# Altium schematic symbol library jlcpcb_2025_04_inductors_extended_0402.schlib: 1396 symbols (part 7 of 8) (continued)
## VHF100505HQ1N8BT
designator L?  Inductance: 1.8nH
Inductor, 1.8nH, SMD 0402; Manufacturer: FH (Guangdong Fenghua Advanced Tech); Manufacturer Part Number: VHF100505HQ1N8BT; Package Size: 0402; JLCPCB Basic Part: No; JLCPCB Part Number: C3032781; Supplier 1: LCSC; Category: Inductors; Supplier Part Number 1: C3032781; RoHS: Yes; ComponentLink1Description: Datasheet; ComponentLink1URL: https://wmsc.lcsc.com/wmsc/upload/file/pdf/v2/lcsc/2302231130_FH--Guangdong-Fenghua-Advanced-Tech-VHF100505HQ1N8BT_C3032781.pdf; ComponentLink2Description: JLCPCB Part URL; ComponentLink2URL: https://jlcpcb.com/partdetail/C3032781; ComponentLink3Description: LCSC Part URL; ComponentLink3URL: https://lcsc.com/product-detail/Inductors-SMD_FH-Guangdong-Fenghua-Advanced-Tech-FH-Guangdong-Fenghua-Advanced-Tech-VHF100505HQ1N8BT_C3032781.html
footprint IND-0402 (0402 (1005M) Inductor)
pins: 1, 2

## VHF100505HQ1N8ST
designator L?  Inductance: 1.8nH
Inductor, 1.8nH, 100mΩ, 300mA, SMD 0402; Manufacturer: FH(Guangdong Fenghua Advanced Tech); Manufacturer Part Number: VHF100505HQ1N8ST; Package Size: 0402; JLCPCB Basic Part: No; JLCPCB Part Number: C395057; Supplier 1: LCSC; Category: Inductors; Supplier Part Number 1: C395057; Rated Current: 300mA; DC Resistance: 100mΩ; RoHS: Yes; ComponentLink1Description: Datasheet; ComponentLink1URL: https://wmsc.lcsc.com/wmsc/upload/file/pdf/v2/lcsc/2302231208_FH--Guangdong-Fenghua-Advanced-Tech-VHF100505HQ1N8ST_C395057.pdf; ComponentLink2Description: JLCPCB Part URL; ComponentLink2URL: https://jlcpcb.com/partdetail/C395057; ComponentLink3Description: LCSC Part URL; ComponentLink3URL: https://lcsc.com/product-detail/Inductors-SMD_FH-Guangdong-Fenghua-Advanced-Tech-FH-Guangdong-Fenghua-Advanced-Tech-VHF100505HQ1N8ST_C395057.html
footprint IND-0402 (0402 (1005M) Inductor)
pins: 1, 2

## VHF100505HQ2N2ST
designator L?  Inductance: 2.2nH
Inductor, 2.2nH, 200mΩ, 300mA, SMD 0402; Manufacturer: FH(Guangdong Fenghua Advanced Tech); Manufacturer Part Number: VHF100505HQ2N2ST; Package Size: 0402; JLCPCB Basic Part: No; JLCPCB Part Number: C395061; Supplier 1: LCSC; Category: Inductors; Supplier Part Number 1: C395061; Rated Current: 300mA; DC Resistance: 200mΩ; RoHS: Yes; ComponentLink1Description: Datasheet; ComponentLink1URL: https://wmsc.lcsc.com/wmsc/upload/file/pdf/v2/lcsc/2302231208_FH--Guangdong-Fenghua-Advanced-Tech-VHF100505HQ2N2ST_C395061.pdf; ComponentLink2Description: JLCPCB Part URL; ComponentLink2URL: https://jlcpcb.com/partdetail/C395061; ComponentLink3Description: LCSC Part URL; ComponentLink3URL: https://lcsc.com/product-detail/Inductors-SMD_FH-Guangdong-Fenghua-Advanced-Tech-FH-Guangdong-Fenghua-Advanced-Tech-VHF100505HQ2N2ST_C395061.html
footprint IND-0402 (0402 (1005M) Inductor)
pins: 1, 2

## VHF100505HQ2N4BT
designator L?  Inductance: 2.4nH
Inductor, 2.4nH, SMD 0402; Manufacturer: FH (Guangdong Fenghua Advanced Tech); Manufacturer Part Number: VHF100505HQ2N4BT; Package Size: 0402; JLCPCB Basic Part: No; JLCPCB Part Number: C3032806; Supplier 1: LCSC; Category: Inductors; Supplier Part Number 1: C3032806; RoHS: Yes; ComponentLink1Description: Datasheet; ComponentLink1URL: https://wmsc.lcsc.com/wmsc/upload/file/pdf/v2/lcsc/2302231030_FH--Guangdong-Fenghua-Advanced-Tech-VHF100505HQ2N4BT_C3032806.pdf; ComponentLink2Description: JLCPCB Part URL; ComponentLink2URL: https://jlcpcb.com/partdetail/C3032806; ComponentLink3Description: LCSC Part URL; ComponentLink3URL: https://lcsc.com/product-detail/Inductors-SMD_FH-Guangdong-Fenghua-Advanced-Tech-FH-Guangdong-Fenghua-Advanced-Tech-VHF100505HQ2N4BT_C3032806.html
footprint IND-0402 (0402 (1005M) Inductor)
pins: 1, 2

## VHF100505HQ2N4ST
designator L?  Inductance: 2.4nH
Inductor, 2.4nH, 200mΩ, 300mA, SMD 0402; Manufacturer: FH(Guangdong Fenghua Advanced Tech); Manufacturer Part Number: VHF100505HQ2N4ST; Package Size: 0402; JLCPCB Basic Part: No; JLCPCB Part Number: C268321; Supplier 1: LCSC; Category: Inductors; Supplier Part Number 1: C268321; Rated Current: 300mA; DC Resistance: 200mΩ; RoHS: Yes; ComponentLink1Description: Datasheet; ComponentLink1URL: https://wmsc.lcsc.com/wmsc/upload/file/pdf/v2/lcsc/2302231230_FH--Guangdong-Fenghua-Advanced-Tech-VHF100505HQ2N4ST_C268321.pdf; ComponentLink2Description: JLCPCB Part URL; ComponentLink2URL: https://jlcpcb.com/partdetail/C268321; ComponentLink3Description: LCSC Part URL; ComponentLink3URL: https://lcsc.com/product-detail/Inductors-SMD_FH-Guangdong-Fenghua-Advanced-Tech-FH-Guangdong-Fenghua-Advanced-Tech-VHF100505HQ2N4ST_C268321.html
footprint IND-0402 (0402 (1005M) Inductor)
pins: 1, 2

## VHF100505HQ2N7ST
designator L?  Inductance: 2.7nH
Inductor, 2.7nH, 200mΩ, 300mA, SMD 0402; Manufacturer: FH(Guangdong Fenghua Advanced Tech); Manufacturer Part Number: VHF100505HQ2N7ST; Package Size: 0402; JLCPCB Basic Part: No; JLCPCB Part Number: C395062; Supplier 1: LCSC; Category: Inductors; Supplier Part Number 1: C395062; Rated Current: 300mA; DC Resistance: 200mΩ; RoHS: Yes; ComponentLink1Description: Datasheet; ComponentLink1URL: https://wmsc.lcsc.com/wmsc/upload/file/pdf/v2/lcsc/2302231208_FH--Guangdong-Fenghua-Advanced-Tech-VHF100505HQ2N7ST_C395062.pdf; ComponentLink2Description: JLCPCB Part URL; ComponentLink2URL: https://jlcpcb.com/partdetail/C395062; ComponentLink3Description: LCSC Part URL; ComponentLink3URL: https://lcsc.com/product-detail/Inductors-SMD_FH-Guangdong-Fenghua-Advanced-Tech-FH-Guangdong-Fenghua-Advanced-Tech-VHF100505HQ2N7ST_C395062.html
footprint IND-0402 (0402 (1005M) Inductor)
pins: 1, 2

## VHF100505HQ3N0ST
designator L?  Inductance: 3nH
Inductor, 3nH, 200mΩ, 300mA, SMD 0402; Manufacturer: FH(Guangdong Fenghua Advanced Tech); Manufacturer Part Number: VHF100505HQ3N0ST; Package Size: 0402; JLCPCB Basic Part: No; JLCPCB Part Number: C395064; Supplier 1: LCSC; Category: Inductors; Supplier Part Number 1: C395064; Rated Current: 300mA; DC Resistance: 200mΩ; RoHS: Yes; ComponentLink1Description: Datasheet; ComponentLink1URL: https://wmsc.lcsc.com/wmsc/upload/file/pdf/v2/lcsc/2302231208_FH--Guangdong-Fenghua-Advanced-Tech-VHF100505HQ3N0ST_C395064.pdf; ComponentLink2Description: JLCPCB Part URL; ComponentLink2URL: https://jlcpcb.com/partdetail/C395064; ComponentLink3Description: LCSC Part URL; ComponentLink3URL: https://lcsc.com/product-detail/Inductors-SMD_FH-Guangdong-Fenghua-Advanced-Tech-FH-Guangdong-Fenghua-Advanced-Tech-VHF100505HQ3N0ST_C395064.html
footprint IND-0402 (0402 (1005M) Inductor)
pins: 1, 2

## VHF100505HQ3N3ST
designator L?  Inductance: 3.3nH
Inductor, 3.3nH, 200mΩ, 300mA, SMD 0402; Manufacturer: FH(Guangdong Fenghua Advanced Tech); Manufacturer Part Number: VHF100505HQ3N3ST; Package Size: 0402; JLCPCB Basic Part: No; JLCPCB Part Number: C395065; Supplier 1: LCSC; Category: Inductors; Supplier Part Number 1: C395065; Rated Current: 300mA; DC Resistance: 200mΩ; RoHS: Yes; ComponentLink1Description: Datasheet; ComponentLink1URL: https://wmsc.lcsc.com/wmsc/upload/file/pdf/v2/lcsc/2302231208_FH--Guangdong-Fenghua-Advanced-Tech-VHF100505HQ3N3ST_C395065.pdf; ComponentLink2Description: JLCPCB Part URL; ComponentLink2URL: https://jlcpcb.com/partdetail/C395065; ComponentLink3Description: LCSC Part URL; ComponentLink3URL: https://lcsc.com/product-detail/Inductors-SMD_FH-Guangdong-Fenghua-Advanced-Tech-FH-Guangdong-Fenghua-Advanced-Tech-VHF100505HQ3N3ST_C395065.html
footprint IND-0402 (0402 (1005M) Inductor)
pins: 1, 2

## VHF100505HQ3N6ST
designator L?  Inductance: 3.6nH
Inductor, 3.6nH, 200mΩ, 300mA, SMD 0402; Manufacturer: FH(Guangdong Fenghua Advanced Tech); Manufacturer Part Number: VHF100505HQ3N6ST; Package Size: 0402; JLCPCB Basic Part: No; JLCPCB Part Number: C395066; Supplier 1: LCSC; Category: Inductors; Supplier Part Number 1: C395066; Rated Current: 300mA; DC Resistance: 200mΩ; RoHS: Yes; ComponentLink1Description: Datasheet; ComponentLink1URL: https://wmsc.lcsc.com/wmsc/upload/file/pdf/v2/lcsc/2302231208_FH--Guangdong-Fenghua-Advanced-Tech-VHF100505HQ3N6ST_C395066.pdf; ComponentLink2Description: JLCPCB Part URL; ComponentLink2URL: https://jlcpcb.com/partdetail/C395066; ComponentLink3Description: LCSC Part URL; ComponentLink3URL: https://lcsc.com/product-detail/Inductors-SMD_FH-Guangdong-Fenghua-Advanced-Tech-FH-Guangdong-Fenghua-Advanced-Tech-VHF100505HQ3N6ST_C395066.html
footprint IND-0402 (0402 (1005M) Inductor)
pins: 1, 2

## VHF100505HQ3N9BT
designator L?  Inductance: 3.9nH
Inductor, 3.9nH, SMD 0402; Manufacturer: FH (Guangdong Fenghua Advanced Tech); Manufacturer Part Number: VHF100505HQ3N9BT; Package Size: 0402; JLCPCB Basic Part: No; JLCPCB Part Number: C3032776; Supplier 1: LCSC; Category: Inductors; Supplier Part Number 1: C3032776; RoHS: Yes; ComponentLink1Description: Datasheet; ComponentLink1URL: https://wmsc.lcsc.com/wmsc/upload/file/pdf/v2/lcsc/2302231130_FH--Guangdong-Fenghua-Advanced-Tech-VHF100505HQ3N9BT_C3032776.pdf; ComponentLink2Description: JLCPCB Part URL; ComponentLink2URL: https://jlcpcb.com/partdetail/C3032776; ComponentLink3Description: LCSC Part URL; ComponentLink3URL: https://lcsc.com/product-detail/Inductors-SMD_FH-Guangdong-Fenghua-Advanced-Tech-FH-Guangdong-Fenghua-Advanced-Tech-VHF100505HQ3N9BT_C3032776.html
footprint IND-0402 (0402 (1005M) Inductor)
pins: 1, 2

## VHF100505HQ3N9ST
designator L?  Inductance: 3.9nH
Inductor, 3.9nH, 250mΩ, 300mA, SMD 0402; Manufacturer: FH(Guangdong Fenghua Advanced Tech); Manufacturer Part Number: VHF100505HQ3N9ST; Package Size: 0402; JLCPCB Basic Part: No; JLCPCB Part Number: C90196; Supplier 1: LCSC; Category: Inductors; Supplier Part Number 1: C90196; Rated Current: 300mA; DC Resistance: 250mΩ; RoHS: Yes; ComponentLink1Description: Datasheet; ComponentLink1URL: https://wmsc.lcsc.com/wmsc/upload/file/pdf/v2/lcsc/2302231230_FH--Guangdong-Fenghua-Advanced-Tech-VHF100505HQ3N9ST_C90196.pdf; ComponentLink2Description: JLCPCB Part URL; ComponentLink2URL: https://jlcpcb.com/partdetail/C90196; ComponentLink3Description: LCSC Part URL; ComponentLink3URL: https://lcsc.com/product-detail/Inductors-SMD_FH-Guangdong-Fenghua-Advanced-Tech-FH-Guangdong-Fenghua-Advanced-Tech-VHF100505HQ3N9ST_C90196.html
footprint IND-0402 (0402 (1005M) Inductor)
pins: 1, 2

## VHF100505HQ4N3ST
designator L?  Inductance: 4.3nH
Inductor, 4.3nH, 200mΩ, 300mA, SMD 0402; Manufacturer: FH(Guangdong Fenghua Advanced Tech); Manufacturer Part Number: VHF100505HQ4N3ST; Package Size: 0402; JLCPCB Basic Part: No; JLCPCB Part Number: C395069; Supplier 1: LCSC; Category: Inductors; Supplier Part Number 1: C395069; Rated Current: 300mA; DC Resistance: 200mΩ; RoHS: Yes; ComponentLink1Description: Datasheet; ComponentLink1URL: https://wmsc.lcsc.com/wmsc/upload/file/pdf/v2/lcsc/2302231208_FH--Guangdong-Fenghua-Advanced-Tech-VHF100505HQ4N3ST_C395069.pdf; ComponentLink2Description: JLCPCB Part URL; ComponentLink2URL: https://jlcpcb.com/partdetail/C395069; ComponentLink3Description: LCSC Part URL; ComponentLink3URL: https://lcsc.com/product-detail/Inductors-SMD_FH-Guangdong-Fenghua-Advanced-Tech-FH-Guangdong-Fenghua-Advanced-Tech-VHF100505HQ4N3ST_C395069.html
footprint IND-0402 (0402 (1005M) Inductor)
pins: 1, 2

## VHF100505HQ4N7ST
designator L?  Inductance: 4.7nH
Inductor, 4.7nH, 200mΩ, 300mA, SMD 0402; Manufacturer: FH(Guangdong Fenghua Advanced Tech); Manufacturer Part Number: VHF100505HQ4N7ST; Package Size: 0402; JLCPCB Basic Part: No; JLCPCB Part Number: C395070; Supplier 1: LCSC; Category: Inductors; Supplier Part Number 1: C395070; Rated Current: 300mA; DC Resistance: 200mΩ; RoHS: Yes; ComponentLink1Description: Datasheet; ComponentLink1URL: https://wmsc.lcsc.com/wmsc/upload/file/pdf/v2/lcsc/2302231208_FH--Guangdong-Fenghua-Advanced-Tech-VHF100505HQ4N7ST_C395070.pdf; ComponentLink2Description: JLCPCB Part URL; ComponentLink2URL: https://jlcpcb.com/partdetail/C395070; ComponentLink3Description: LCSC Part URL; ComponentLink3URL: https://lcsc.com/product-detail/Inductors-SMD_FH-Guangdong-Fenghua-Advanced-Tech-FH-Guangdong-Fenghua-Advanced-Tech-VHF100505HQ4N7ST_C395070.html
footprint IND-0402 (0402 (1005M) Inductor)
pins: 1, 2

## VHF100505HQ5N1ST
designator L?  Inductance: 5.1nH
Inductor, 5.1nH, 300mΩ, 300mA, SMD 0402; Manufacturer: FH(Guangdong Fenghua Advanced Tech); Manufacturer Part Number: VHF100505HQ5N1ST; Package Size: 0402; JLCPCB Basic Part: No; JLCPCB Part Number: C395072; Supplier 1: LCSC; Category: Inductors; Supplier Part Number 1: C395072; Rated Current: 300mA; DC Resistance: 300mΩ; RoHS: Yes; ComponentLink1Description: Datasheet; ComponentLink1URL: https://wmsc.lcsc.com/wmsc/upload/file/pdf/v2/lcsc/2302231208_FH--Guangdong-Fenghua-Advanced-Tech-VHF100505HQ5N1ST_C395072.pdf; ComponentLink2Description: JLCPCB Part URL; ComponentLink2URL: https://jlcpcb.com/partdetail/C395072; ComponentLink3Description: LCSC Part URL; ComponentLink3URL: https://lcsc.com/product-detail/Inductors-SMD_FH-Guangdong-Fenghua-Advanced-Tech-FH-Guangdong-Fenghua-Advanced-Tech-VHF100505HQ5N1ST_C395072.html
footprint IND-0402 (0402 (1005M) Inductor)
pins: 1, 2

## VHF100505HQ5N6ST
designator L?  Inductance: 5.6nH
Inductor, 5.6nH, 300mΩ, 300mA, SMD 0402; Manufacturer: FH(Guangdong Fenghua Advanced Tech); Manufacturer Part Number: VHF100505HQ5N6ST; Package Size: 0402; JLCPCB Basic Part: No; JLCPCB Part Number: C395073; Supplier 1: LCSC; Category: Inductors; Supplier Part Number 1: C395073; Rated Current: 300mA; DC Resistance: 300mΩ; RoHS: Yes; ComponentLink1Description: Datasheet; ComponentLink1URL: https://wmsc.lcsc.com/wmsc/upload/file/pdf/v2/lcsc/2302231208_FH--Guangdong-Fenghua-Advanced-Tech-VHF100505HQ5N6ST_C395073.pdf; ComponentLink2Description: JLCPCB Part URL; ComponentLink2URL: https://jlcpcb.com/partdetail/C395073; ComponentLink3Description: LCSC Part URL; ComponentLink3URL: https://lcsc.com/product-detail/Inductors-SMD_FH-Guangdong-Fenghua-Advanced-Tech-FH-Guangdong-Fenghua-Advanced-Tech-VHF100505HQ5N6ST_C395073.html
footprint IND-0402 (0402 (1005M) Inductor)
pins: 1, 2

## VHF100505HQ6N2ST
designator L?  Inductance: 6.2nH
Inductor, 6.2nH, 300mΩ, 300mA, SMD 0402; Manufacturer: FH(Guangdong Fenghua Advanced Tech); Manufacturer Part Number: VHF100505HQ6N2ST; Package Size: 0402; JLCPCB Basic Part: No; JLCPCB Part Number: C395074; Supplier 1: LCSC; Category: Inductors; Supplier Part Number 1: C395074; Rated Current: 300mA; DC Resistance: 300mΩ; RoHS: Yes; ComponentLink1Description: Datasheet; ComponentLink1URL: https://wmsc.lcsc.com/wmsc/upload/file/pdf/v2/lcsc/2302231208_FH--Guangdong-Fenghua-Advanced-Tech-VHF100505HQ6N2ST_C395074.pdf; ComponentLink2Description: JLCPCB Part URL; ComponentLink2URL: https://jlcpcb.com/partdetail/C395074; ComponentLink3Description: LCSC Part URL; ComponentLink3URL: https://lcsc.com/product-detail/Inductors-SMD_FH-Guangdong-Fenghua-Advanced-Tech-FH-Guangdong-Fenghua-Advanced-Tech-VHF100505HQ6N2ST_C395074.html
footprint IND-0402 (0402 (1005M) Inductor)
pins: 1, 2

## VHF100505HQ6N8HT
designator L?  Inductance: 6.8nH
Inductor, 6.8nH, ±3%, SMD 0402; Manufacturer: FH (Guangdong Fenghua Advanced Tech); Manufacturer Part Number: VHF100505HQ6N8HT; Package Size: 0402; JLCPCB Basic Part: No; JLCPCB Part Number: C3032784; Supplier 1: LCSC; Category: Inductors; Supplier Part Number 1: C3032784; Tolerance: ±3%; RoHS: Yes; ComponentLink1Description: Datasheet; ComponentLink1URL: https://wmsc.lcsc.com/wmsc/upload/file/pdf/v2/lcsc/2302231130_FH--Guangdong-Fenghua-Advanced-Tech-VHF100505HQ6N8HT_C3032784.pdf; ComponentLink2Description: JLCPCB Part URL; ComponentLink2URL: https://jlcpcb.com/partdetail/C3032784; ComponentLink3Description: LCSC Part URL; ComponentLink3URL: https://lcsc.com/product-detail/Inductors-SMD_FH-Guangdong-Fenghua-Advanced-Tech-FH-Guangdong-Fenghua-Advanced-Tech-VHF100505HQ6N8HT_C3032784.html
footprint IND-0402 (0402 (1005M) Inductor)
pins: 1, 2

## VHF100505HQ6N8JT
designator L?  Inductance: 6.8nH
Inductor, 6.8nH, ±5%, 300mΩ, 300mA, SMD 0402; Manufacturer: FH(Guangdong Fenghua Advanced Tech); Manufacturer Part Number: VHF100505HQ6N8JT; Package Size: 0402; JLCPCB Basic Part: No; JLCPCB Part Number: C395075; Supplier 1: LCSC; Category: Inductors; Supplier Part Number 1: C395075; Tolerance: ±5%; Rated Current: 300mA; DC Resistance: 300mΩ; RoHS: Yes; ComponentLink1Description: Datasheet; ComponentLink1URL: https://wmsc.lcsc.com/wmsc/upload/file/pdf/v2/lcsc/2302231208_FH--Guangdong-Fenghua-Advanced-Tech-VHF100505HQ6N8JT_C395075.pdf; ComponentLink2Description: JLCPCB Part URL; ComponentLink2URL: https://jlcpcb.com/partdetail/C395075; ComponentLink3Description: LCSC Part URL; ComponentLink3URL: https://lcsc.com/product-detail/Inductors-SMD_FH-Guangdong-Fenghua-Advanced-Tech-FH-Guangdong-Fenghua-Advanced-Tech-VHF100505HQ6N8JT_C395075.html
footprint IND-0402 (0402 (1005M) Inductor)
pins: 1, 2

## VHF100505HQ7N5HT
designator L?  Inductance: 7.5nH
Inductor, 7.5nH, ±3%, SMD 0402; Manufacturer: FH (Guangdong Fenghua Advanced Tech); Manufacturer Part Number: VHF100505HQ7N5HT; Package Size: 0402; JLCPCB Basic Part: No; JLCPCB Part Number: C3032805; Supplier 1: LCSC; Category: Inductors; Supplier Part Number 1: C3032805; Tolerance: ±3%; RoHS: Yes; ComponentLink1Description: Datasheet; ComponentLink1URL: https://wmsc.lcsc.com/wmsc/upload/file/pdf/v2/lcsc/2302231030_FH--Guangdong-Fenghua-Advanced-Tech-VHF100505HQ7N5HT_C3032805.pdf; ComponentLink2Description: JLCPCB Part URL; ComponentLink2URL: https://jlcpcb.com/partdetail/C3032805; ComponentLink3Description: LCSC Part URL; ComponentLink3URL: https://lcsc.com/product-detail/Inductors-SMD_FH-Guangdong-Fenghua-Advanced-Tech-FH-Guangdong-Fenghua-Advanced-Tech-VHF100505HQ7N5HT_C3032805.html
footprint IND-0402 (0402 (1005M) Inductor)
pins: 1, 2

## VHF100505HQ7N5JT
designator L?  Inductance: 7.5nH
Inductor, 7.5nH, ±5%, 400mΩ, 300mA, SMD 0402; Manufacturer: FH(Guangdong Fenghua Advanced Tech); Manufacturer Part Number: VHF100505HQ7N5JT; Package Size: 0402; JLCPCB Basic Part: No; JLCPCB Part Number: C268322; Supplier 1: LCSC; Category: Inductors; Supplier Part Number 1: C268322; Tolerance: ±5%; Rated Current: 300mA; DC Resistance: 400mΩ; RoHS: Yes; ComponentLink1Description: Datasheet; ComponentLink1URL: https://wmsc.lcsc.com/wmsc/upload/file/pdf/v2/lcsc/2302231230_FH--Guangdong-Fenghua-Advanced-Tech-VHF100505HQ7N5JT_C268322.pdf; ComponentLink2Description: JLCPCB Part URL; ComponentLink2URL: https://jlcpcb.com/partdetail/C268322; ComponentLink3Description: LCSC Part URL; ComponentLink3URL: https://lcsc.com/product-detail/Inductors-SMD_FH-Guangdong-Fenghua-Advanced-Tech-FH-Guangdong-Fenghua-Advanced-Tech-VHF100505HQ7N5JT_C268322.html
footprint IND-0402 (0402 (1005M) Inductor)
pins: 1, 2

## VHF100505HQ8N2JT
designator L?  Inductance: 8.2nH
Inductor, 8.2nH, ±5%, 450mΩ, 250mA, SMD 0402; Manufacturer: FH(Guangdong Fenghua Advanced Tech); Manufacturer Part Number: VHF100505HQ8N2JT; Package Size: 0402; JLCPCB Basic Part: No; JLCPCB Part Number: C90138; Supplier 1: LCSC; Category: Inductors; Supplier Part Number 1: C90138; Tolerance: ±5%; Rated Current: 250mA; DC Resistance: 450mΩ; RoHS: Yes; ComponentLink1Description: Datasheet; ComponentLink1URL: https://wmsc.lcsc.com/wmsc/upload/file/pdf/v2/lcsc/2302231230_FH--Guangdong-Fenghua-Advanced-Tech-VHF100505HQ8N2JT_C90138.pdf; ComponentLink2Description: JLCPCB Part URL; ComponentLink2URL: https://jlcpcb.com/partdetail/C90138; ComponentLink3Description: LCSC Part URL; ComponentLink3URL: https://lcsc.com/product-detail/Inductors-SMD_FH-Guangdong-Fenghua-Advanced-Tech-FH-Guangdong-Fenghua-Advanced-Tech-VHF100505HQ8N2JT_C90138.html
footprint IND-0402 (0402 (1005M) Inductor)
pins: 1, 2

## VHF100505HQ9N1JT
designator L?  Inductance: 9.1nH
Inductor, 9.1nH, ±5%, 400mΩ, 300mA, SMD 0402; Manufacturer: FH(Guangdong Fenghua Advanced Tech); Manufacturer Part Number: VHF100505HQ9N1JT; Package Size: 0402; JLCPCB Basic Part: No; JLCPCB Part Number: C395077; Supplier 1: LCSC; Category: Inductors; Supplier Part Number 1: C395077; Tolerance: ±5%; Rated Current: 300mA; DC Resistance: 400mΩ; RoHS: Yes; ComponentLink1Description: Datasheet; ComponentLink1URL: https://wmsc.lcsc.com/wmsc/upload/file/pdf/v2/lcsc/2302081009_FH--Guangdong-Fenghua-Advanced-Tech-VHF100505HQ9N1JT_C395077.pdf; ComponentLink2Description: JLCPCB Part URL; ComponentLink2URL: https://jlcpcb.com/partdetail/C395077; ComponentLink3Description: LCSC Part URL; ComponentLink3URL: https://lcsc.com/product-detail/Inductors-SMD_FH-Guangdong-Fenghua-Advanced-Tech-FH-Guangdong-Fenghua-Advanced-Tech-VHF100505HQ9N1JT_C395077.html
footprint IND-0402 (0402 (1005M) Inductor)
pins: 1, 2

## VHF100505HQ10NJT
designator L?  Inductance: 10nH
Inductor, 10nH, ±5%, 400mΩ, 300mA, SMD 0402; Manufacturer: FH(Guangdong Fenghua Advanced Tech); Manufacturer Part Number: VHF100505HQ10NJT; Package Size: 0402; JLCPCB Basic Part: No; JLCPCB Part Number: C395047; Supplier 1: LCSC; Category: Inductors; Supplier Part Number 1: C395047; Tolerance: ±5%; Rated Current: 300mA; DC Resistance: 400mΩ; RoHS: Yes; ComponentLink1Description: Datasheet; ComponentLink1URL: https://wmsc.lcsc.com/wmsc/upload/file/pdf/v2/lcsc/2302231208_FH--Guangdong-Fenghua-Advanced-Tech-VHF100505HQ10NJT_C395047.pdf; ComponentLink2Description: JLCPCB Part URL; ComponentLink2URL: https://jlcpcb.com/partdetail/C395047; ComponentLink3Description: LCSC Part URL; ComponentLink3URL: https://lcsc.com/product-detail/Inductors-SMD_FH-Guangdong-Fenghua-Advanced-Tech-FH-Guangdong-Fenghua-Advanced-Tech-VHF100505HQ10NJT_C395047.html
footprint IND-0402 (0402 (1005M) Inductor)
pins: 1, 2

## VHF100505HQ12NJT
designator L?  Inductance: 12nH
Inductor, 12nH, ±5%, 500mΩ, 300mA, SMD 0402; Manufacturer: FH(Guangdong Fenghua Advanced Tech); Manufacturer Part Number: VHF100505HQ12NJT; Package Size: 0402; JLCPCB Basic Part: No; JLCPCB Part Number: C395048; Supplier 1: LCSC; Category: Inductors; Supplier Part Number 1: C395048; Tolerance: ±5%; Rated Current: 300mA; DC Resistance: 500mΩ; RoHS: Yes; ComponentLink1Description: Datasheet; ComponentLink1URL: https://wmsc.lcsc.com/wmsc/upload/file/pdf/v2/lcsc/2302231208_FH--Guangdong-Fenghua-Advanced-Tech-VHF100505HQ12NJT_C395048.pdf; ComponentLink2Description: JLCPCB Part URL; ComponentLink2URL: https://jlcpcb.com/partdetail/C395048; ComponentLink3Description: LCSC Part URL; ComponentLink3URL: https://lcsc.com/product-detail/Inductors-SMD_FH-Guangdong-Fenghua-Advanced-Tech-FH-Guangdong-Fenghua-Advanced-Tech-VHF100505HQ12NJT_C395048.html
footprint IND-0402 (0402 (1005M) Inductor)
pins: 1, 2

## VHF100505HQ15NJT
designator L?  Inductance: 15nH
Inductor, 15nH, ±5%, 500mΩ, 300mA, SMD 0402; Manufacturer: FH(Guangdong Fenghua Advanced Tech); Manufacturer Part Number: VHF100505HQ15NJT; Package Size: 0402; JLCPCB Basic Part: No; JLCPCB Part Number: C395049; Supplier 1: LCSC; Category: Inductors; Supplier Part Number 1: C395049; Tolerance: ±5%; Rated Current: 300mA; DC Resistance: 500mΩ; RoHS: Yes; ComponentLink1Description: Datasheet; ComponentLink1URL: https://wmsc.lcsc.com/wmsc/upload/file/pdf/v2/lcsc/2302231208_FH--Guangdong-Fenghua-Advanced-Tech-VHF100505HQ15NJT_C395049.pdf; ComponentLink2Description: JLCPCB Part URL; ComponentLink2URL: https://jlcpcb.com/partdetail/C395049; ComponentLink3Description: LCSC Part URL; ComponentLink3URL: https://lcsc.com/product-detail/Inductors-SMD_FH-Guangdong-Fenghua-Advanced-Tech-FH-Guangdong-Fenghua-Advanced-Tech-VHF100505HQ15NJT_C395049.html
footprint IND-0402 (0402 (1005M) Inductor)
pins: 1, 2

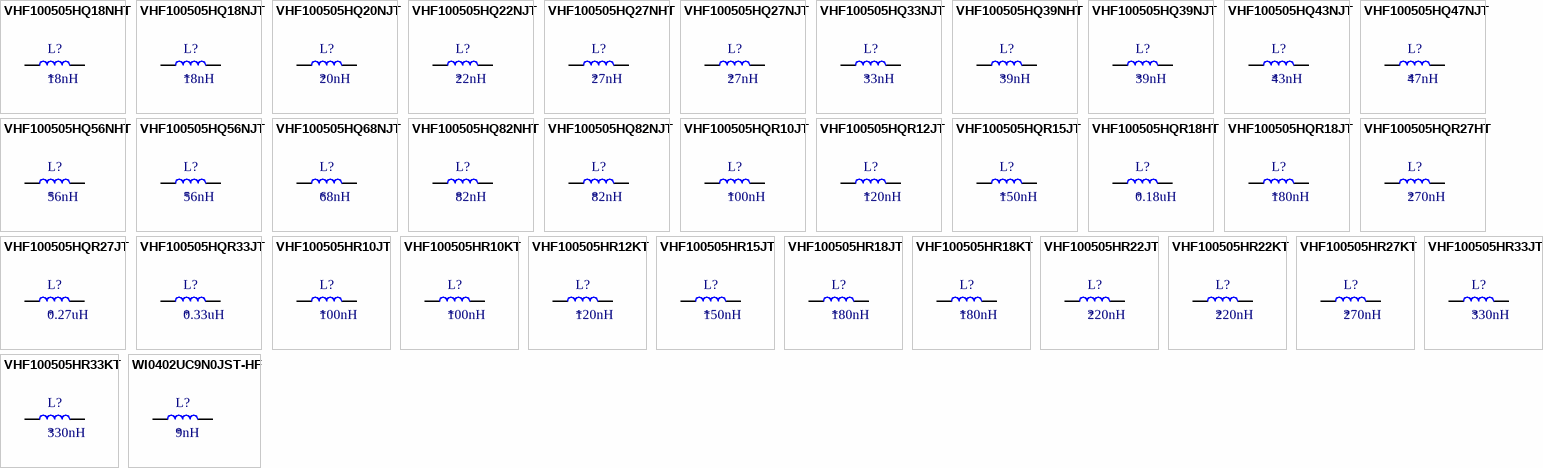
[diagram p34: symbols VHF100505HQ18NHT to WI0402UC9N0JST-HF]

## VHF100505HQ18NHT
designator L?  Inductance: 18nH
Inductor, 18nH, ±3%, SMD 0402; Manufacturer: FH (Guangdong Fenghua Advanced Tech); Manufacturer Part Number: VHF100505HQ18NHT; Package Size: 0402; JLCPCB Basic Part: No; JLCPCB Part Number: C3032778; Supplier 1: LCSC; Category: Inductors; Supplier Part Number 1: C3032778; Tolerance: ±3%; RoHS: Yes; ComponentLink1Description: Datasheet; ComponentLink1URL: https://wmsc.lcsc.com/wmsc/upload/file/pdf/v2/lcsc/2302231130_FH--Guangdong-Fenghua-Advanced-Tech-VHF100505HQ18NHT_C3032778.pdf; ComponentLink2Description: JLCPCB Part URL; ComponentLink2URL: https://jlcpcb.com/partdetail/C3032778; ComponentLink3Description: LCSC Part URL; ComponentLink3URL: https://lcsc.com/product-detail/Inductors-SMD_FH-Guangdong-Fenghua-Advanced-Tech-FH-Guangdong-Fenghua-Advanced-Tech-VHF100505HQ18NHT_C3032778.html
footprint IND-0402 (0402 (1005M) Inductor)
pins: 1, 2

## VHF100505HQ18NJT
designator L?  Inductance: 18nH
Inductor, 18nH, ±5%, 600mΩ, 300mA, SMD 0402; Manufacturer: FH(Guangdong Fenghua Advanced Tech); Manufacturer Part Number: VHF100505HQ18NJT; Package Size: 0402; JLCPCB Basic Part: No; JLCPCB Part Number: C395050; Supplier 1: LCSC; Category: Inductors; Supplier Part Number 1: C395050; Tolerance: ±5%; Rated Current: 300mA; DC Resistance: 600mΩ; RoHS: Yes; ComponentLink1Description: Datasheet; ComponentLink1URL: https://wmsc.lcsc.com/wmsc/upload/file/pdf/v2/lcsc/2302231208_FH--Guangdong-Fenghua-Advanced-Tech-VHF100505HQ18NJT_C395050.pdf; ComponentLink2Description: JLCPCB Part URL; ComponentLink2URL: https://jlcpcb.com/partdetail/C395050; ComponentLink3Description: LCSC Part URL; ComponentLink3URL: https://lcsc.com/product-detail/Inductors-SMD_FH-Guangdong-Fenghua-Advanced-Tech-FH-Guangdong-Fenghua-Advanced-Tech-VHF100505HQ18NJT_C395050.html
footprint IND-0402 (0402 (1005M) Inductor)
pins: 1, 2

## VHF100505HQ20NJT
designator L?  Inductance: 20nH
Inductor, 20nH, ±5%, 600mΩ, 300mA, SMD 0402; Manufacturer: FH(Guangdong Fenghua Advanced Tech); Manufacturer Part Number: VHF100505HQ20NJT; Package Size: 0402; JLCPCB Basic Part: No; JLCPCB Part Number: C395058; Supplier 1: LCSC; Category: Inductors; Supplier Part Number 1: C395058; Tolerance: ±5%; Rated Current: 300mA; DC Resistance: 600mΩ; RoHS: Yes; ComponentLink1Description: Datasheet; ComponentLink1URL: https://wmsc.lcsc.com/wmsc/upload/file/pdf/v2/lcsc/2302231208_FH--Guangdong-Fenghua-Advanced-Tech-VHF100505HQ20NJT_C395058.pdf; ComponentLink2Description: JLCPCB Part URL; ComponentLink2URL: https://jlcpcb.com/partdetail/C395058; ComponentLink3Description: LCSC Part URL; ComponentLink3URL: https://lcsc.com/product-detail/Inductors-SMD_FH-Guangdong-Fenghua-Advanced-Tech-FH-Guangdong-Fenghua-Advanced-Tech-VHF100505HQ20NJT_C395058.html
footprint IND-0402 (0402 (1005M) Inductor)
pins: 1, 2

## VHF100505HQ22NJT
designator L?  Inductance: 22nH
Inductor, 22nH, ±5%, 600mΩ, 300mA, SMD 0402; Manufacturer: FH(Guangdong Fenghua Advanced Tech); Manufacturer Part Number: VHF100505HQ22NJT; Package Size: 0402; JLCPCB Basic Part: No; JLCPCB Part Number: C395059; Supplier 1: LCSC; Category: Inductors; Supplier Part Number 1: C395059; Tolerance: ±5%; Rated Current: 300mA; DC Resistance: 600mΩ; RoHS: Yes; ComponentLink1Description: Datasheet; ComponentLink1URL: https://wmsc.lcsc.com/wmsc/upload/file/pdf/v2/lcsc/2302231208_FH--Guangdong-Fenghua-Advanced-Tech-VHF100505HQ22NJT_C395059.pdf; ComponentLink2Description: JLCPCB Part URL; ComponentLink2URL: https://jlcpcb.com/partdetail/C395059; ComponentLink3Description: LCSC Part URL; ComponentLink3URL: https://lcsc.com/product-detail/Inductors-SMD_FH-Guangdong-Fenghua-Advanced-Tech-FH-Guangdong-Fenghua-Advanced-Tech-VHF100505HQ22NJT_C395059.html
footprint IND-0402 (0402 (1005M) Inductor)
pins: 1, 2

## VHF100505HQ27NHT
designator L?  Inductance: 27nH
Inductor, 27nH, ±3%, SMD 0402; Manufacturer: FH (Guangdong Fenghua Advanced Tech); Manufacturer Part Number: VHF100505HQ27NHT; Package Size: 0402; JLCPCB Basic Part: No; JLCPCB Part Number: C3032782; Supplier 1: LCSC; Category: Inductors; Supplier Part Number 1: C3032782; Tolerance: ±3%; RoHS: Yes; ComponentLink1Description: Datasheet; ComponentLink1URL: https://wmsc.lcsc.com/wmsc/upload/file/pdf/v2/lcsc/2302231130_FH--Guangdong-Fenghua-Advanced-Tech-VHF100505HQ27NHT_C3032782.pdf; ComponentLink2Description: JLCPCB Part URL; ComponentLink2URL: https://jlcpcb.com/partdetail/C3032782; ComponentLink3Description: LCSC Part URL; ComponentLink3URL: https://lcsc.com/product-detail/Inductors-SMD_FH-Guangdong-Fenghua-Advanced-Tech-FH-Guangdong-Fenghua-Advanced-Tech-VHF100505HQ27NHT_C3032782.html
footprint IND-0402 (0402 (1005M) Inductor)
pins: 1, 2

## VHF100505HQ27NJT
designator L?  Inductance: 27nH
Inductor, 27nH, ±5%, 700mΩ, 300mA, SMD 0402; Manufacturer: FH(Guangdong Fenghua Advanced Tech); Manufacturer Part Number: VHF100505HQ27NJT; Package Size: 0402; JLCPCB Basic Part: No; JLCPCB Part Number: C391309; Supplier 1: LCSC; Category: Inductors; Supplier Part Number 1: C391309; Tolerance: ±5%; Rated Current: 300mA; DC Resistance: 700mΩ; RoHS: Yes; ComponentLink1Description: Datasheet; ComponentLink1URL: https://wmsc.lcsc.com/wmsc/upload/file/pdf/v2/lcsc/2302231208_FH--Guangdong-Fenghua-Advanced-Tech-VHF100505HQ27NJT_C391309.pdf; ComponentLink2Description: JLCPCB Part URL; ComponentLink2URL: https://jlcpcb.com/partdetail/C391309; ComponentLink3Description: LCSC Part URL; ComponentLink3URL: https://lcsc.com/product-detail/Inductors-SMD_FH-Guangdong-Fenghua-Advanced-Tech-FH-Guangdong-Fenghua-Advanced-Tech-VHF100505HQ27NJT_C391309.html
footprint IND-0402 (0402 (1005M) Inductor)
pins: 1, 2

## VHF100505HQ33NJT
designator L?  Inductance: 33nH
Inductor, 33nH, ±5%, 1.1Ω, 200mA, SMD 0402; Manufacturer: FH(Guangdong Fenghua Advanced Tech); Manufacturer Part Number: VHF100505HQ33NJT; Package Size: 0402; JLCPCB Basic Part: No; JLCPCB Part Number: C90178; Supplier 1: LCSC; Category: Inductors; Supplier Part Number 1: C90178; Tolerance: ±5%; Rated Current: 200mA; DC Resistance: 1.1Ω; RoHS: Yes; ComponentLink1Description: Datasheet; ComponentLink1URL: https://wmsc.lcsc.com/wmsc/upload/file/pdf/v2/lcsc/2302231230_FH--Guangdong-Fenghua-Advanced-Tech-VHF100505HQ33NJT_C90178.pdf; ComponentLink2Description: JLCPCB Part URL; ComponentLink2URL: https://jlcpcb.com/partdetail/C90178; ComponentLink3Description: LCSC Part URL; ComponentLink3URL: https://lcsc.com/product-detail/Inductors-SMD_FH-Guangdong-Fenghua-Advanced-Tech-FH-Guangdong-Fenghua-Advanced-Tech-VHF100505HQ33NJT_C90178.html
footprint IND-0402 (0402 (1005M) Inductor)
pins: 1, 2

## VHF100505HQ39NHT
designator L?  Inductance: 39nH
Inductor, 39nH, ±3%, SMD 0402; Manufacturer: FH (Guangdong Fenghua Advanced Tech); Manufacturer Part Number: VHF100505HQ39NHT; Package Size: 0402; JLCPCB Basic Part: No; JLCPCB Part Number: C3032802; Supplier 1: LCSC; Category: Inductors; Supplier Part Number 1: C3032802; Tolerance: ±3%; RoHS: Yes; ComponentLink1Description: Datasheet; ComponentLink1URL: https://wmsc.lcsc.com/wmsc/upload/file/pdf/v2/lcsc/2302231130_FH--Guangdong-Fenghua-Advanced-Tech-VHF100505HQ39NHT_C3032802.pdf; ComponentLink2Description: JLCPCB Part URL; ComponentLink2URL: https://jlcpcb.com/partdetail/C3032802; ComponentLink3Description: LCSC Part URL; ComponentLink3URL: https://lcsc.com/product-detail/Inductors-SMD_FH-Guangdong-Fenghua-Advanced-Tech-FH-Guangdong-Fenghua-Advanced-Tech-VHF100505HQ39NHT_C3032802.html
footprint IND-0402 (0402 (1005M) Inductor)
pins: 1, 2

## VHF100505HQ39NJT
designator L?  Inductance: 39nH
Inductor, 39nH, ±5%, 1Ω, 200mA, SMD 0402; Manufacturer: FH(Guangdong Fenghua Advanced Tech); Manufacturer Part Number: VHF100505HQ39NJT; Package Size: 0402; JLCPCB Basic Part: No; JLCPCB Part Number: C395063; Supplier 1: LCSC; Category: Inductors; Supplier Part Number 1: C395063; Tolerance: ±5%; Rated Current: 200mA; DC Resistance: 1Ω; RoHS: Yes; ComponentLink1Description: Datasheet; ComponentLink1URL: https://wmsc.lcsc.com/wmsc/upload/file/pdf/v2/lcsc/2302231208_FH--Guangdong-Fenghua-Advanced-Tech-VHF100505HQ39NJT_C395063.pdf; ComponentLink2Description: JLCPCB Part URL; ComponentLink2URL: https://jlcpcb.com/partdetail/C395063; ComponentLink3Description: LCSC Part URL; ComponentLink3URL: https://lcsc.com/product-detail/Inductors-SMD_FH-Guangdong-Fenghua-Advanced-Tech-FH-Guangdong-Fenghua-Advanced-Tech-VHF100505HQ39NJT_C395063.html
footprint IND-0402 (0402 (1005M) Inductor)
pins: 1, 2

## VHF100505HQ43NJT
designator L?  Inductance: 43nH
Inductor, 43nH, ±5%, 1.1Ω, 200mA, SMD 0402; Manufacturer: FH(Guangdong Fenghua Advanced Tech); Manufacturer Part Number: VHF100505HQ43NJT; Package Size: 0402; JLCPCB Basic Part: No; JLCPCB Part Number: C395067; Supplier 1: LCSC; Category: Inductors; Supplier Part Number 1: C395067; Tolerance: ±5%; Rated Current: 200mA; DC Resistance: 1.1Ω; RoHS: Yes; ComponentLink1Description: Datasheet; ComponentLink1URL: https://wmsc.lcsc.com/wmsc/upload/file/pdf/v2/lcsc/2302231208_FH--Guangdong-Fenghua-Advanced-Tech-VHF100505HQ43NJT_C395067.pdf; ComponentLink2Description: JLCPCB Part URL; ComponentLink2URL: https://jlcpcb.com/partdetail/C395067; ComponentLink3Description: LCSC Part URL; ComponentLink3URL: https://lcsc.com/product-detail/Inductors-SMD_FH-Guangdong-Fenghua-Advanced-Tech-FH-Guangdong-Fenghua-Advanced-Tech-VHF100505HQ43NJT_C395067.html
footprint IND-0402 (0402 (1005M) Inductor)
pins: 1, 2